# Altium footprint library 我的元件库01.PcbLib: 321 footprints (part 19 of 21)
Each footprint in its own frame and in the unit in brackets; x right, y up, seen from the top. Pads: shape width x height; smd on the part's side, far side on the other; paste and mask are expansions set on the pad; w line width, h text height; cw(c..) or ccw(c..) is an arc to the next point about the centre after c.
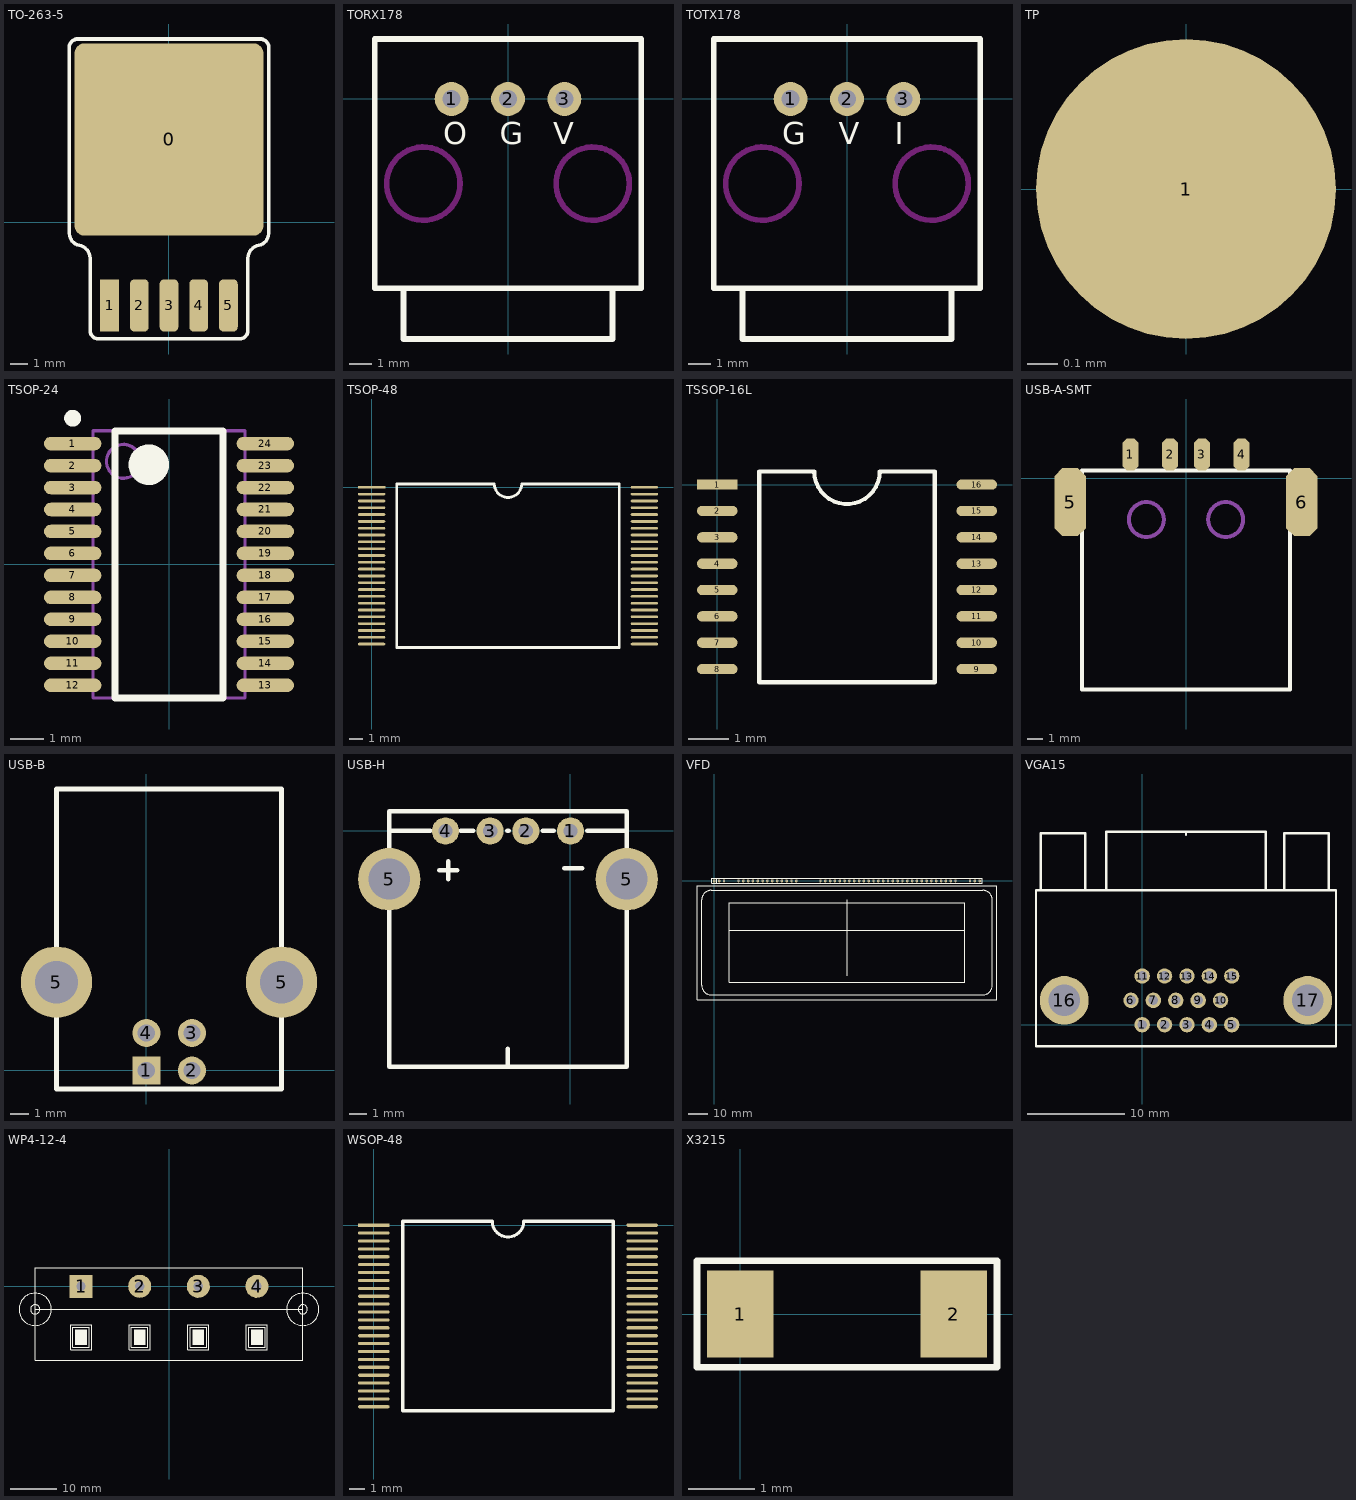
[diagram p18: the footprints below, top view; thin cyan lines are the x and y axes]

## TO-263-3 [mm]

## TO-263-5 [mm]
pads (6):
  rrect10% 10.8x11 smd: 0(0,4.75)
  rect 1.07x3 smd: 1(-3.4,-4.75)
  rrect50% 1.07x3 smd: 2(-1.7,-4.75) 3(0,-4.75) 4(1.7,-4.75) 5(3.4,-4.75)
Top Overlay:
  lines w0.2: -4.512,-6.122 ccw(c-4.028,-6.181) -4.125,-6.659 ; 4.125,-6.659 ccw(c4.028,-6.181) 4.512,-6.122
  lines w0.203: -5.7,10.05 -5.7,-0.53 ccw(c-5.005,-0.615) -5.145,-1.301 cw(c-5.306,-2.084) -4.512,-2.181 -4.512,-6.122 ; -5.7,10.109 cw(c-5.222,10.011) -5.299,10.493 ; -5.3,10.5 5.3,10.5 ; -4.125,-6.659 4.125,-6.659 ; 4.512,-6.122 4.512,-2.181 cw(c5.306,-2.084) 5.145,-1.301 ccw(c5.005,-0.615) 5.7,-0.53 5.7,10.05 ; 5.299,10.493 cw(c5.222,10.011) 5.7,10.109
3D body "SW3dPS-LTC DD-PAK.STEP": height 4.48, standoff 0, extent -5.137,-4.801 5.086,9.55

## TORX178 [mil]
height 767.72
pads (3):
  round 60 hole 31.5: 1(-100,0) 2(0,0) 3(100,0)
Top Overlay:
  lines w10: -185.04,-335.04 -185.04,-425.2 185.04,-425.2 185.04,-335.04 ; -236.22,-335.04 -236.22,106.3 236.22,106.3 236.22,-335.04 -236.22,-335.04
  text "V" at 80,-80 h39.37
  text "G" at -15,-80 h39.37
  text "O" at -115,-80 h39.37
Keep-Out Layer:
  circle w10: c-150,-150 r64.96
  circle w10: c150,-150 r64.96

## TOTX178 [mil]
height 767.72
pads (3):
  round 60 hole 31.5: 1(-100,0) 2(0,0) 3(100,0)
Top Overlay:
  lines w10: -185.04,-335.04 -185.04,-425.2 185.04,-425.2 185.04,-335.04 ; -236.22,-335.04 236.22,-335.04 236.22,106.3 -236.22,106.3 -236.22,-335.04
  text "V" at -15,-80 h39.37
  text "G" at -115,-80 h39.37
  text "I" at 85,-80 h39.37
Keep-Out Layer:
  circle w10: c150,-150 r64.96
  circle w10: c-150,-150 r64.96

## TP [mm]
pads (1):
  round 1 smd: 1(0,0)

## TSOP-24 [mm] "TSOP, 24-Leads, Body 7.80x4.40mm, Pitch 0.65mm, IPC Medium Density"
height 1.2
pads (24):
  oval 1.7x0.4 smd: 1(-2.85,3.575) 2(-2.85,2.925) 3(-2.85,2.275) 4(-2.85,1.625) 5(-2.85,0.975) 6(-2.85,0.325) 7(-2.85,-0.325) 8(-2.85,-0.975) 9(-2.85,-1.625) 10(-2.85,-2.275) 11(-2.85,-2.925) 12(-2.85,-3.575) 13(2.85,-3.575) 14(2.85,-2.925) 15(2.85,-2.275) 16(2.85,-1.625) 17(2.85,-0.975) 18(2.85,-0.325) 19(2.85,0.325) 20(2.85,0.975) 21(2.85,1.625) 22(2.85,2.275) 23(2.85,2.925) 24(2.85,3.575)
Top Overlay:
  circle w0.6: c-0.6,2.95 r0.3
  circle w0.25: c-2.85,4.325 r0.125
  lines w0.2: -1.6,-3.95 1.6,-3.95 1.6,3.95 -1.6,3.95 -1.6,-3.95
Mechanical 13:
  circle w0.1: c-1.35,3.05 r0.5
  lines w0.1: -2.25,-3.95 2.25,-3.95 2.25,3.95 -2.25,3.95 -2.25,-3.95
3D body: height 1.2, standoff 0.1, extent -2.25,-3.95 2.25,3.95

## TSOP-48 [mm]
pads (48):
  rect 2x0.2 smd: 1(0,0)
  oval 2x0.2 smd: 2(0,-0.5) 3(0,-1) 4(0,-1.5) 5(0,-2) 6(0,-2.5) 7(0,-3) 8(0,-3.5) 9(0,-4) 10(0,-4.5) 11(0,-5) 12(0,-5.5) 13(0,-6) 14(0,-6.5) 15(0,-7) 16(0,-7.5) 17(0,-8) 18(0,-8.5) 19(0,-9) 20(0,-9.5) 21(0,-10) 22(0,-10.5) 23(0,-11) 24(0,-11.5) 25(20,-11.5) 26(20,-11) 27(20,-10.5) 28(20,-10) 29(20,-9.5) 30(20,-9) 31(20,-8.5) 32(20,-8) 33(20,-7.5) 34(20,-7) 35(20,-6.5) 36(20,-6) 37(20,-5.5) 38(20,-5) 39(20,-4.5) 40(20,-4) 41(20,-3.5) 42(20,-3) 43(20,-2.5) 44(20,-2) 45(20,-1.5) 46(20,-1) 47(20,-0.5) 48(20,0)
Top Overlay:
  lines w0.2: 1.835,-11.75 18.165,-11.75 18.165,0.25 11,0.25 cw(c10,0.25) 9,0.25 1.835,0.25 1.835,-11.75
3D body "User Library-TSOP-48.STEP": height 1.1, standoff 0, extent -0.045,-11.746 19.959,0.254

## TSSOP-16L [mm]
height 1.2
pads (16):
  rect 1x0.254 smd: 1(0,0)
  oval 1x0.254 smd: 2(0,-0.65) 3(0,-1.3) 4(0,-1.95) 5(0,-2.6) 6(0,-3.25) 7(0,-3.9) 8(0,-4.55) 9(6.4,-4.55) 10(6.4,-3.9) 11(6.4,-3.25) 12(6.4,-2.6) 13(6.4,-1.95) 14(6.4,-1.3) 15(6.4,-0.65) 16(6.4,0)
Top Overlay:
  lines w0.1: 2.388,0.325 1.035,0.325 1.035,-4.875 5.365,-4.875 5.365,0.325 4.013,0.325 ; 2.392,0.325 ccw(c3.2,0.325) 4.008,0.325
3D body "SW3dPS-JEDEC MO-153 (TSSOP).STEP": height 1.2, standoff 0, extent -0.002,-4.775 6.454,0.225

## USB-A-SMT [mm]
pads (6):
  oct 1x2 smd: 1(-3.5,1.5) 2(-1,1.5) 3(1,1.5) 4(3.5,1.5)
  oct 2x4.3 smd: 5(-7.3,-1.5) 6(7.3,-1.5)
Top Overlay:
  lines w0.254: -6.55,-13.3 6.55,-13.3 6.55,0.5 -6.55,0.5 -6.55,-13.3
Mechanical 1:
  circle w0.254: c2.5,-2.6 r1.1
  circle w0.254: c-2.5,-2.6 r1.1
3D body "Samtec-USB-A-S-F-B-SM1.STEP": height 6.35, standoff -1.53, extent -7.289,-13.267 7.311,1.863

## USB-B [mm]
pads (6):
  rect 1.5x1.5 hole 0.92: 1(0,0)
  round 1.5 hole 0.92: 2(2.43,0) 3(2.43,2) 4(0,2)
  round 3.8 hole 2.28: 5(-4.793,4.713) 5(7.207,4.713)
Top Overlay:
  lines w0.254: -4.793,-0.987 -4.793,15.013 7.207,15.013 7.207,-0.987 -4.793,-0.987
3D body "USB-B.step": height 3.13, standoff -11.09, extent -6.134,-0.914 8.725,15.386

## USB-H [mm]
pads (6):
  round 1.524 hole 0.8: 1(0,0) 2(-2.5,0) 3(-4.5,0) 4(-7,0)
  round 3.5 hole 2.3: 5(-10.15,-2.7) 5(3.15,-2.7)
Top Overlay:
  lines w0.254: -10.15,0 -7.85,0 ; -7.35,-2.2 -6.35,-2.2 ; -6.85,-2.7 -6.85,-1.7 ; -6.15,0 -5.45,0 ; -3.55,0 -3.45,0 ; -3.51,-13.2 -3.51,-12.2 ; -1.55,0 -0.95,0 ; -0.35,-2.1 0.65,-2.1 ; 0.95,0 3.15,0 ; -10.15,-13.2 3.15,-13.2 3.15,1.1 -10.15,1.1 -10.15,-13.2
3D body "Samtec-USBR-A-S-S-O-TH.STEP": height 7.55, standoff -3.3, extent -11.405,-13.06 4.395,1.1

## VFD [mil]
pads (48):
  rect 50x60 hole 32: 1(0,0)
  oval 50x65 hole 32: 2(100,0) 3(200,0) 4(500,0) 5(600,0) 6(700,0) 7(800,0) 8(900,0) 9(1000,0) 10(1100,0) 11(1200,0) 12(1300,0) 13(1400,0) 14(1500,0) 15(1600,0) 16(1700,0) 17(2200,0) 18(2300,0) 19(2400,0) 20(2500,0) 21(2600,0) 22(2700,0) 23(2800,0) 24(2900,0) 25(3000,0) 26(3100,0) 27(3200,0) 28(3300,0) 29(3400,0) 30(3500,0) 31(3600,0) 32(3700,0) 33(3800,0) 34(3900,0) 35(4000,0) 36(4100,0) 37(4200,0) 38(4300,0) 39(4400,0) 40(4500,0) 41(4600,0) 42(4700,0) 43(4800,0) 44(4900,0) 45(5000,0) 46(5300,0) 47(5400,0) 48(5500,0)
Top Overlay:
  lines w10: 50,-50 50,50 ; 309.06,-1023.62 5185.94,-1023.62 ; 2750,-1968.5 2750,-393.7 ; -360.24,-2460.63 5860.24,-2460.63 5860.24,-98.43 -360.24,-98.43 -360.24,-2460.63 ; -261.81,-2165.35 ccw(c-64.96,-2165.35) -64.96,-2362.2 5564.96,-2362.2 ccw(c5564.96,-2165.35) 5761.81,-2165.35 5761.81,-393.7 ccw(c5564.96,-393.7) 5564.96,-196.85 -64.96,-196.85 ccw(c-64.96,-393.7) -261.81,-393.7 -261.81,-2165.35 ; -50,-50 5550,-50 5550,50 -50,50 -50,-50 ; 309.06,-2106.3 5190.94,-2106.3 5190.94,-452.76 309.06,-452.76 309.06,-2106.3

## VGA15 [mm]
pads (17):
  round 1.58 hole 1: 1(0,0) 2(2.3,0) 3(4.6,0) 4(6.9,0) 5(9.2,0) 6(-1.15,2.5) 7(1.15,2.5) 8(3.45,2.5) 9(5.75,2.5) 10(8.05,2.5) 11(0,5) 12(2.3,5) 13(4.6,5) 14(6.9,5) 15(9.2,5)
  round 5 hole 3.25: 16(-8,2.5) 17(17,2.5)
Top Overlay:
  lines w0.254: -10.9,-2.2 -10.9,13.8 19.9,13.8 19.9,-2.2 -10.89,-2.2 -10.9,-2.19 ; -10.4,13.8 -10.4,19.67 -5.83,19.67 -5.83,13.82 ; -3.7,13.8 -3.7,19.8 12.7,19.8 12.7,13.8 ; 4.5,19.5 4.5,19.8 ; 14.6,13.8 14.6,19.68 19.18,19.68 19.18,13.84
3D body "SW3dPS-Connector, D-Sub, 15 pin HD, RA, Receptacle.STEP": height 12.77, standoff -3.27, extent -11.055,-0.875 19.755,20.225

## WP4-12-4 [mm]
pads (4):
  rect 5x5 hole 2: 1(-19.05,0)
  round 5 hole 2: 2(-6.35,0) 3(6.35,0) 4(19.05,0)
Top Overlay:
  circle w0.254: c29,-5 r3.5
  circle w0.254: c-29,-5 r3.5
  circle w0.254: c-29,-5 r1
  circle w0.254: c29,-5 r1
  rectangle: 17.78,-12.7 20.32,-9.398
  rectangle: 5.08,-12.7 7.62,-9.398
  rectangle: -7.62,-12.7 -5.08,-9.398
  rectangle: -20.32,-12.7 -17.78,-9.398
  lines w0.178: -21.336,-13.716 -21.336,-8.382 -16.764,-8.382 -16.764,-13.716 -21.336,-13.716 ; -20.828,-13.208 -20.828,-8.89 -17.272,-8.89 -17.272,-13.208 -20.828,-13.208 ; -8.636,-13.716 -8.636,-8.382 -4.064,-8.382 -4.064,-13.716 -8.636,-13.716 ; -8.128,-13.208 -8.128,-8.89 -4.572,-8.89 -4.572,-13.208 -8.128,-13.208 ; 4.064,-13.716 4.064,-8.382 8.636,-8.382 8.636,-13.716 4.064,-13.716 ; 4.572,-13.208 4.572,-8.89 8.128,-8.89 8.128,-13.208 4.572,-13.208 ; 16.764,-13.716 16.764,-8.382 21.336,-8.382 21.336,-13.716 16.764,-13.716 ; 17.272,-13.208 17.272,-8.89 20.828,-8.89 20.828,-13.208 17.272,-13.208
  lines w0.254: -29,-5 29,-5 ; -29,-16 29,-16 29,4 -29,4 -29,-16

## WSOP-48 [mm]
pads (48):
  rect 2x0.2 smd: 1(0,0)
  oval 2x0.2 smd: 2(0,-0.5) 3(0,-1) 4(0,-1.5) 5(0,-2) 6(0,-2.5) 7(0,-3) 8(0,-3.5) 9(0,-4) 10(0,-4.5) 11(0,-5) 12(0,-5.5) 13(0,-6) 14(0,-6.5) 15(0,-7) 16(0,-7.5) 17(0,-8) 18(0,-8.5) 19(0,-9) 20(0,-9.5) 21(0,-10) 22(0,-10.5) 23(0,-11) 24(0,-11.5) 25(17,-11.5) 26(17,-11) 27(17,-10.5) 28(17,-10) 29(17,-9.5) 30(17,-9) 31(17,-8.5) 32(17,-8) 33(17,-7.5) 34(17,-7) 35(17,-6.5) 36(17,-6) 37(17,-5.5) 38(17,-5) 39(17,-4.5) 40(17,-4) 41(17,-3.5) 42(17,-3) 43(17,-2.5) 44(17,-2) 45(17,-1.5) 46(17,-1) 47(17,-0.5) 48(17,0)
Top Overlay:
  lines w0.2: 1.835,-11.75 1.835,0.25 7.5,0.25 ccw(c8.5,0.25) 9.5,0.25 15.165,0.25 15.165,-11.75 1.835,-11.75

## X3215 [mm]
pads (2):
  rect 1x1.3 smd: 1(0,0) 2(3.2,0)
Top Overlay:
  lines w0.1: -0.65,-0.8 -0.65,0.8 3.85,0.8 3.85,-0.8 -0.65,-0.8
3D body "User Library-X3215.STEP": height 0.81, standoff 0, extent 0,-0.762 3.2,0.738